# Altium footprint library Design III PCB Library.PcbLib: 89 footprints (part 1 of 6)
Each footprint in its own frame and in the unit in brackets; x right, y up, seen from the top. Pads: shape width x height; smd on the part's side, far side on the other; paste and mask are expansions set on the pad; w line width, h text height; cw(c..) or ccw(c..) is an arc to the next point about the centre after c.
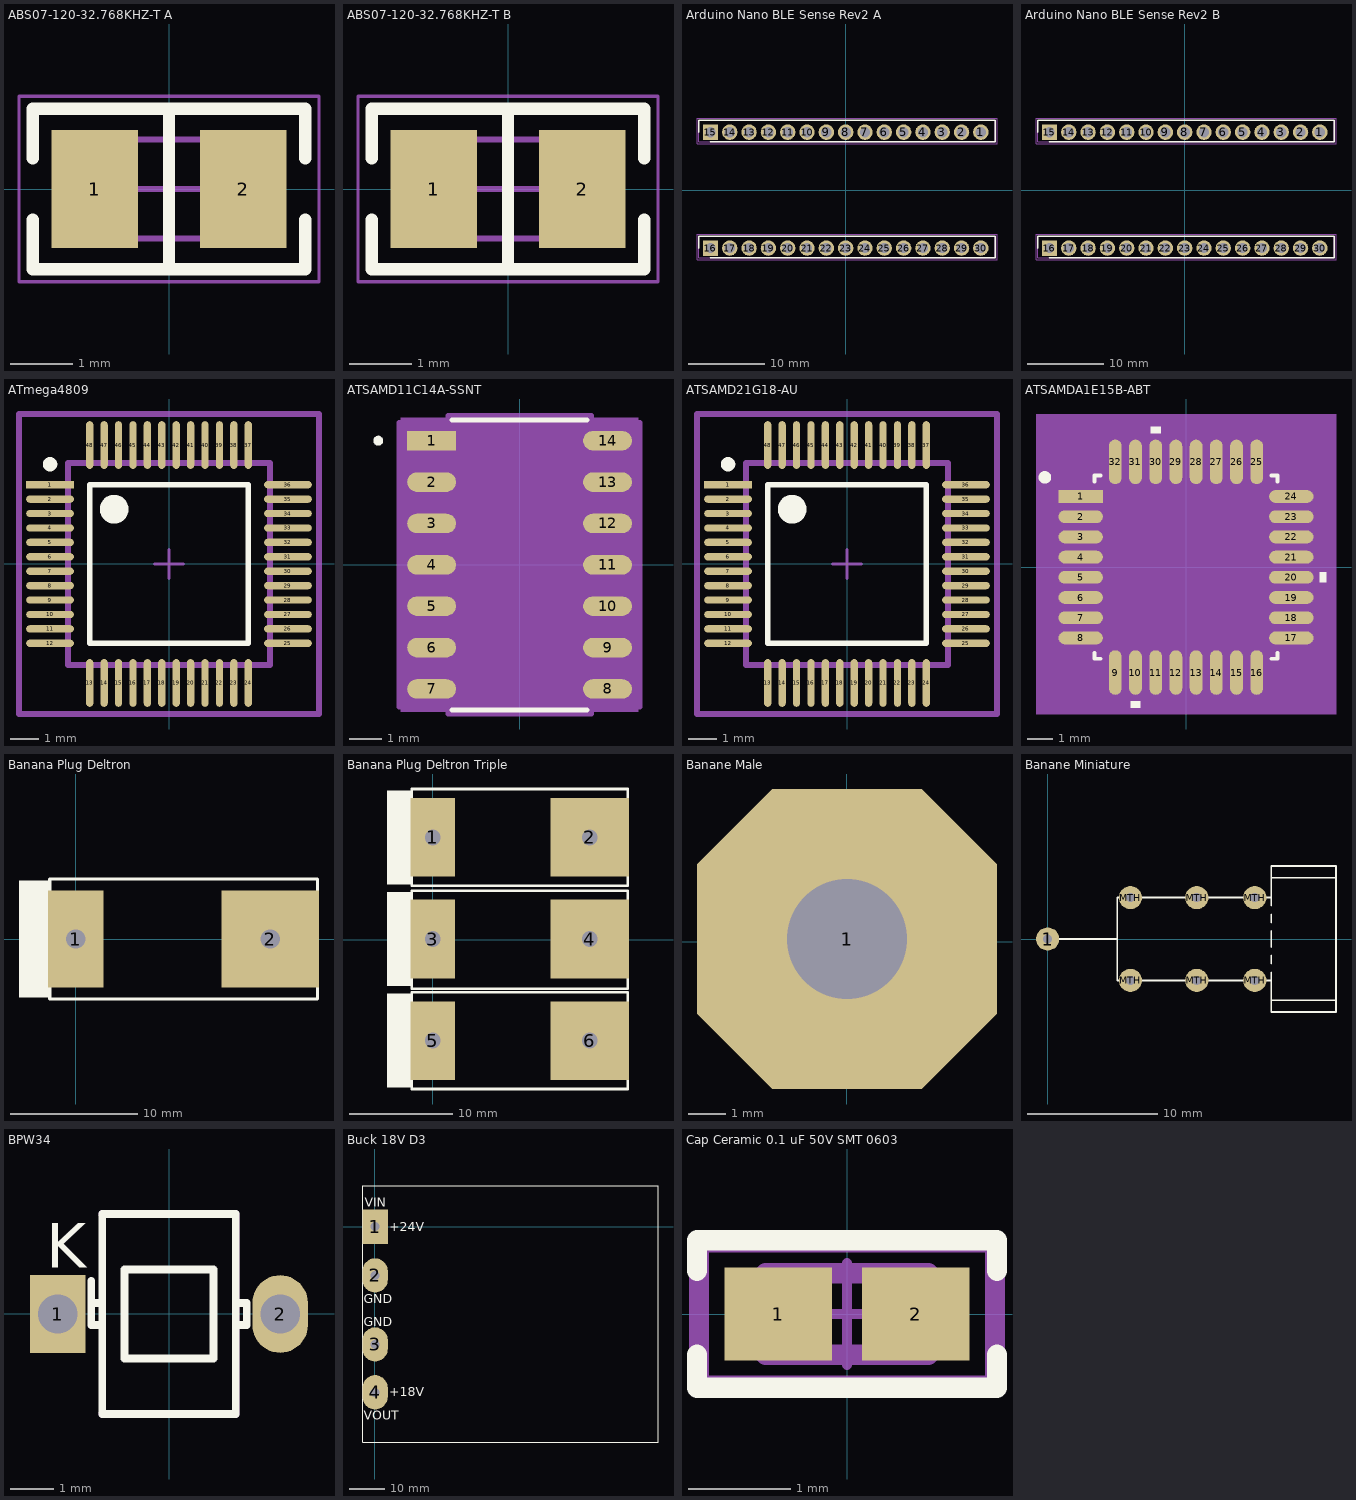
[diagram p0: the footprints below, top view; thin cyan lines are the x and y axes]

## ABS07-120-32.768KHZ-T A [mm] "32.768 kHz ±20ppm Crystal 6pF 55 kOhms 2-SMD, No Lead"
pads (2):
  rect 1.4x1.9 smd: 1(-1.2,0) 2(1.2,0)
Top Overlay:
  lines w0.2: -2.2,-0.5 -2.2,-1.3 2.2,-1.3 2.2,-0.5 ; -2.2,0.5 -2.2,1.3 2.2,1.3 2.2,0.5 ; 0,-1.3 0,1.3
Mechanical 13:
  lines w0.1: -1.65,-0.8 1.65,-0.8 1.65,0.8 -1.65,0.8 -1.65,-0.8
Mechanical 15:
  lines w0.05: -2.425,-1.5 -2.425,1.5 2.425,1.5 2.425,-1.5 -2.425,-1.5
  lines w0.1: -0.5,0 0.5,0 ; 0,-0.5 0,0.5
3D body "Crys_Abracon_ABS07-120-32_768KHZ-T_eec.STEP": height 0.25, standoff 0, extent -1.85,-1 1.85,1

## ABS07-120-32.768KHZ-T B [mm] "32.768 kHz ±20ppm Crystal 6pF 55 kOhms 2-SMD, No Lead"
pads (2):
  rect 1.4x1.9 smd: 1(-1.2,0) 2(1.2,0)
Top Overlay:
  lines w0.2: -2.2,-0.5 -2.2,-1.3 2.2,-1.3 2.2,-0.5 ; -2.2,0.5 -2.2,1.3 2.2,1.3 2.2,0.5 ; 0,-1.3 0,1.3
Mechanical 13:
  lines w0.1: -1.65,-0.8 1.65,-0.8 1.65,0.8 -1.65,0.8 -1.65,-0.8
Mechanical 15:
  lines w0.05: -2.425,-1.5 2.425,-1.5 2.425,1.5 -2.425,1.5 -2.425,-1.5
  lines w0.1: -0.5,0 0.5,0 ; 0,-0.5 0,0.5
3D body "Abracon ABS07.STEP": height 0.9, standoff 0, extent -1.625,-0.775 1.625,0.775

## Arduino Nano BLE Sense Rev2 A [mm] "ABX00069, nRF52840 64MHz, 256 KB SRAM, 1MB flash, 14 I/O pins, 8 Analog inputs"
pads (30):
  round 2.025 hole 1.35: 1(17.78,7.62) 2(15.24,7.62) 3(12.7,7.62) 4(10.16,7.62) 5(7.62,7.62) 6(5.08,7.62) 7(2.54,7.62) 8(0,7.62) 9(-2.54,7.62) 10(-5.08,7.62) 11(-7.62,7.62) 12(-10.16,7.62) 13(-12.7,7.62) 14(-15.24,7.62) 17(-15.24,-7.62) 18(-12.7,-7.62) 19(-10.16,-7.62) 20(-7.62,-7.62) 21(-5.08,-7.62) 22(-2.54,-7.62) 23(0,-7.62) 24(2.54,-7.62) 25(5.08,-7.62) 26(7.62,-7.62) 27(10.16,-7.62) 28(12.7,-7.62) 29(15.24,-7.62) 30(17.78,-7.62)
  rect 2.025x2.025 hole 1.35: 15(-17.78,7.62) 16(-17.78,-7.62)
Top Overlay:
  lines w0.2: -19.3,-7.62 -19.3,-6.05 19.65,-6.05 19.65,-8.89 -17.78,-8.89 ; -19.3,7.62 -19.3,9.19 19.65,9.19 19.65,6.35 -17.78,6.35
Mechanical 13:
  lines w0.1: -19.3,-8.89 -19.3,-6.05 19.65,-6.05 19.65,-8.89 -19.3,-8.89 ; -19.3,6.35 -19.3,9.19 19.65,9.19 19.65,6.35 -19.3,6.35
Mechanical 15:
  lines w0.05: -19.55,-9.14 -19.55,-5.8 19.9,-5.8 19.9,-9.14 -19.55,-9.14 ; -19.55,6.1 -19.55,9.44 19.9,9.44 19.9,6.1 -19.55,6.1
3D body "Arduino Nano BLE Sense Rev2.STEP": height 6.65, standoff -6.2, extent -23.06,-8.89 21.59,8.943

## Arduino Nano BLE Sense Rev2 B [mm] "ABX00069, nRF52840 64MHz, 256 KB SRAM, 1MB flash, 14 I/O pins, 8 Analog inputs"
pads (30):
  round 2.025 hole 1.35: 1(17.78,7.62) 2(15.24,7.62) 3(12.7,7.62) 4(10.16,7.62) 5(7.62,7.62) 6(5.08,7.62) 7(2.54,7.62) 8(0,7.62) 9(-2.54,7.62) 10(-5.08,7.62) 11(-7.62,7.62) 12(-10.16,7.62) 13(-12.7,7.62) 14(-15.24,7.62) 17(-15.24,-7.62) 18(-12.7,-7.62) 19(-10.16,-7.62) 20(-7.62,-7.62) 21(-5.08,-7.62) 22(-2.54,-7.62) 23(0,-7.62) 24(2.54,-7.62) 25(5.08,-7.62) 26(7.62,-7.62) 27(10.16,-7.62) 28(12.7,-7.62) 29(15.24,-7.62) 30(17.78,-7.62)
  rect 2.025x2.025 hole 1.35: 15(-17.78,7.62) 16(-17.78,-7.62)
Top Overlay:
  lines w0.2: -19.3,-7.62 -19.3,-6.05 19.65,-6.05 19.65,-8.89 -17.78,-8.89 ; -19.3,7.62 -19.3,9.19 19.65,9.19 19.65,6.35 -17.78,6.35
Mechanical 13:
  lines w0.1: -19.3,-8.89 -19.3,-6.05 19.65,-6.05 19.65,-8.89 -19.3,-8.89 ; -19.3,6.35 -19.3,9.19 19.65,9.19 19.65,6.35 -19.3,6.35
Mechanical 15:
  lines w0.05: -19.55,-9.14 -19.55,-5.8 19.9,-5.8 19.9,-9.14 -19.55,-9.14 ; -19.55,6.1 -19.55,9.44 19.9,9.44 19.9,6.1 -19.55,6.1

## ATmega4809 [mm] "AVR megaAVR® 0, Functional Safety (FuSa) Microcontroller IC 8-Bit 20MHz 48KB (24K x 16) FLASH 48-TQFP (7x7)"
pads (48):
  rect 1.655x0.252 smd paste+0 mask+0: 1(-4.125,2.75)
  rrect100% 1.655x0.252 smd paste+0 mask+0: 2(-4.125,2.25) 3(-4.125,1.75) 4(-4.125,1.25) 5(-4.125,0.75) 6(-4.125,0.25) 7(-4.125,-0.25) 8(-4.125,-0.75) 9(-4.125,-1.25) 10(-4.125,-1.75) 11(-4.125,-2.25) 12(-4.125,-2.75) 25(4.125,-2.75) 26(4.125,-2.25) 27(4.125,-1.75) 28(4.125,-1.25) 29(4.125,-0.75) 30(4.125,-0.25) 31(4.125,0.25) 32(4.125,0.75) 33(4.125,1.25) 34(4.125,1.75) 35(4.125,2.25) 36(4.125,2.75)
  rrect100% 0.252x1.655 smd paste+0 mask+0: 13(-2.75,-4.125) 14(-2.25,-4.125) 15(-1.75,-4.125) 16(-1.25,-4.125) 17(-0.75,-4.125) 18(-0.25,-4.125) 19(0.25,-4.125) 20(0.75,-4.125) 21(1.25,-4.125) 22(1.75,-4.125) 23(2.25,-4.125) 24(2.75,-4.125) 37(2.75,4.125) 38(2.25,4.125) 39(1.75,4.125) 40(1.25,4.125) 41(0.75,4.125) 42(0.25,4.125) 43(-0.25,4.125) 44(-0.75,4.125) 45(-1.25,4.125) 46(-1.75,4.125) 47(-2.25,4.125) 48(-2.75,4.125)
Top Overlay:
  circle w0.25: c-4.125,3.46 r0.125
  circle w0.5: c-1.9,1.9 r0.25
  lines w0.2: -2.75,-2.75 2.75,-2.75 2.75,2.75 -2.75,2.75 -2.75,-2.75
Top Assembly:
  lines w0.2: -5.203,-5.203 5.203,-5.203 5.203,5.203 -5.203,5.203 -5.203,-5.203
Top Courtyard:
  lines w0.2: -5.203,-5.203 5.203,-5.203 5.203,5.203 -5.203,5.203 -5.203,-5.203
Board:
  lines w0.2: -3.5,-3.5 3.5,-3.5 3.5,3.5 -3.5,3.5 -3.5,-3.5
Top Component Center:
  lines w0.1: -0.5,0 0.5,0 ; 0,-0.5 0,0.5
3D body "IC_Microchip_PIC24FJ256GA705-I-PT_eec.STEP": height 0.25, standoff 0, extent -5.203,-5.203 5.203,5.203

## ATSAMD11C14A-SSNT [mm] "ARM® Cortex®-M0+ SAM D11C Microcontroller IC 32-Bit Single-Core 48MHz 16KB (16K x 8) FLASH 14-SOIC"
pads (14):
  rect 1.5x0.6 smd paste+0 mask+0: 1(-2.7,3.81)
  oval 1.5x0.6 smd paste+0 mask+0: 2(-2.7,2.54) 3(-2.7,1.27) 4(-2.7,0) 5(-2.7,-1.27) 6(-2.7,-2.54) 7(-2.7,-3.81) 8(2.7,-3.81) 9(2.7,-2.54) 10(2.7,-1.27) 11(2.7,0) 12(2.7,1.27) 13(2.7,2.54) 14(2.7,3.81)
Top Overlay:
  circle w0.152: c-4.339,3.81 r0.076
  lines w0.152: -2.077,-4.452 2.077,-4.452 ; -2.077,4.452 2.077,4.452
Mechanical 5:
  region: 3.641,-4.516 -3.641,-4.516 -3.641,4.516 3.641,4.516
Mechanical 13:
  circle w0: c-1.696,3.81 r0.038
  lines w0: -0.305,4.325 ccw(c0,4.325) 0.305,4.325
  lines w0.025: -1.95,-4.325 1.95,-4.325 1.95,4.325 -1.95,4.325 -1.95,-4.325
Mechanical 15:
  region: -2.204,-4.364 -3.704,-4.364 -3.704,4.364 -2.204,4.364 -2.204,4.579 2.204,4.579 2.204,4.364 3.704,4.364 3.704,-4.364 2.204,-4.364 2.204,-4.579 -2.204,-4.579
  lines w0.152: -3.704,-4.364 -3.704,4.364 -2.204,4.364 -2.204,4.579 2.204,4.579 2.204,4.364 3.704,4.364 3.704,-4.364 2.204,-4.364 2.204,-4.579 -2.204,-4.579 -2.204,-4.364 -3.704,-4.364
3D body "SOIC14_SL_MCH.step": height 1.75, standoff 0, extent -3.1,-4.325 3.1,4.325

## ATSAMD21G18-AU [mm] "ARM® Cortex®-M0+ SAM D21G, Functional Safety (FuSa) Microcontroller IC 32-Bit Single-Core 48MHz 256KB (256K x 8) FLASH 48-TQFP (7x7)"
pads (48):
  rect 1.655x0.252 smd paste+0 mask+0: 1(-4.125,2.75)
  rrect100% 1.655x0.252 smd paste+0 mask+0: 2(-4.125,2.25) 3(-4.125,1.75) 4(-4.125,1.25) 5(-4.125,0.75) 6(-4.125,0.25) 7(-4.125,-0.25) 8(-4.125,-0.75) 9(-4.125,-1.25) 10(-4.125,-1.75) 11(-4.125,-2.25) 12(-4.125,-2.75) 25(4.125,-2.75) 26(4.125,-2.25) 27(4.125,-1.75) 28(4.125,-1.25) 29(4.125,-0.75) 30(4.125,-0.25) 31(4.125,0.25) 32(4.125,0.75) 33(4.125,1.25) 34(4.125,1.75) 35(4.125,2.25) 36(4.125,2.75)
  rrect100% 0.252x1.655 smd paste+0 mask+0: 13(-2.75,-4.125) 14(-2.25,-4.125) 15(-1.75,-4.125) 16(-1.25,-4.125) 17(-0.75,-4.125) 18(-0.25,-4.125) 19(0.25,-4.125) 20(0.75,-4.125) 21(1.25,-4.125) 22(1.75,-4.125) 23(2.25,-4.125) 24(2.75,-4.125) 37(2.75,4.125) 38(2.25,4.125) 39(1.75,4.125) 40(1.25,4.125) 41(0.75,4.125) 42(0.25,4.125) 43(-0.25,4.125) 44(-0.75,4.125) 45(-1.25,4.125) 46(-1.75,4.125) 47(-2.25,4.125) 48(-2.75,4.125)
Top Overlay:
  circle w0.25: c-4.125,3.46 r0.125
  circle w0.5: c-1.9,1.9 r0.25
  lines w0.2: -2.75,-2.75 2.75,-2.75 2.75,2.75 -2.75,2.75 -2.75,-2.75
Top Assembly:
  lines w0.2: -5.203,-5.203 5.203,-5.203 5.203,5.203 -5.203,5.203 -5.203,-5.203
Top 3D Body:
  lines w0.2: -3.5,-3.5 3.5,-3.5 3.5,3.5 -3.5,3.5 -3.5,-3.5
Top Courtyard:
  lines w0.2: -5.203,-5.203 5.203,-5.203 5.203,5.203 -5.203,5.203 -5.203,-5.203
Top Component Center:
  lines w0.1: -0.5,0 0.5,0 ; 0,-0.5 0,0.5
3D body "IC_Microchip_PIC24FJ256GA705-I-PT_eec.STEP": height 0.25, standoff 0, extent -5.203,-5.203 5.203,5.203

## ATSAMDA1E15B-ABT [mm]
pads (32):
  rect 1.762x0.507 smd paste+0 mask+0: 1(-4.169,2.8)
  oval 1.762x0.507 smd paste+0 mask+0: 2(-4.169,2) 3(-4.169,1.2) 4(-4.169,0.4) 5(-4.169,-0.4) 6(-4.169,-1.2) 7(-4.169,-2) 8(-4.169,-2.8) 17(4.169,-2.8) 18(4.169,-2) 19(4.169,-1.2) 20(4.169,-0.4) 21(4.169,0.4) 22(4.169,1.2) 23(4.169,2) 24(4.169,2.8)
  oval 0.507x1.762 smd paste+0 mask+0: 9(-2.8,-4.169) 10(-2,-4.169) 11(-1.2,-4.169) 12(-0.4,-4.169) 13(0.4,-4.169) 14(1.2,-4.169) 15(2,-4.169) 16(2.8,-4.169) 25(2.8,4.169) 26(2,4.169) 27(1.2,4.169) 28(0.4,4.169) 29(-0.4,4.169) 30(-1.2,4.169) 31(-2,4.169) 32(-2.8,4.169)
Top Overlay:
  circle w0.25: c-5.588,3.556 r0.125
  region: -1.81,-5.304 -2.191,-5.304 -2.191,-5.558 -1.81,-5.558
  region: 5.304,-0.209 5.558,-0.209 5.558,-0.59 5.304,-0.59
  region: -1.01,5.304 -1.391,5.304 -1.391,5.558 -1.01,5.558
  lines w0.152: -3.627,-3.386 -3.627,-3.627 -3.386,-3.627 ; -3.627,3.386 -3.627,3.627 -3.386,3.627 ; 3.386,-3.627 3.627,-3.627 3.627,-3.386 ; 3.386,3.627 3.627,3.627 3.627,3.386
Mechanical 5:
  region: 5.939,-5.812 -5.939,-5.812 -5.939,6.066 5.939,6.066
Mechanical 13:
  lines w0.025: -3.5,2.23 -2.23,3.5 ; -4.5,-3.029 -4.5,-2.571 -3.5,-2.571 -3.5,-3.029 -4.5,-3.029 ; -4.5,-2.229 -4.5,-1.771 -3.5,-1.771 -3.5,-2.229 -4.5,-2.229 ; -4.5,-1.429 -4.5,-0.971 -3.5,-0.971 -3.5,-1.429 -4.5,-1.429 ; -4.5,-0.629 -4.5,-0.171 -3.5,-0.171 -3.5,-0.629 -4.5,-0.629 ; -4.5,0.171 -4.5,0.629 -3.5,0.629 -3.5,0.171 -4.5,0.171 ; -4.5,0.971 -4.5,1.429 -3.5,1.429 -3.5,0.971 -4.5,0.971 ; -4.5,1.771 -4.5,2.229 -3.5,2.229 -3.5,1.771 -4.5,1.771 ; -4.5,2.571 -4.5,3.029 -3.5,3.029 -3.5,2.571 -4.5,2.571 ; -3.5,-3.5 -3.5,3.5 3.5,3.5 3.5,-3.5 -3.5,-3.5 ; -3.029,-4.5 -3.029,-3.5 -2.571,-3.5 -2.571,-4.5 -3.029,-4.5 ; -3.029,3.5 -2.571,3.5 -2.571,4.5 -3.029,4.5 -3.029,3.5 ; -2.229,-4.5 -2.229,-3.5 -1.771,-3.5 -1.771,-4.5 -2.229,-4.5 ; -2.229,3.5 -1.771,3.5 -1.771,4.5 -2.229,4.5 -2.229,3.5 ; -1.429,-4.5 -1.429,-3.5 -0.971,-3.5 -0.971,-4.5 -1.429,-4.5 ; -1.429,3.5 -0.971,3.5 -0.971,4.5 -1.429,4.5 -1.429,3.5 ; -0.629,-4.5 -0.629,-3.5 -0.171,-3.5 -0.171,-4.5 -0.629,-4.5 ; -0.629,3.5 -0.171,3.5 -0.171,4.5 -0.629,4.5 -0.629,3.5 ; 0.171,-4.5 0.171,-3.5 0.629,-3.5 0.629,-4.5 0.171,-4.5 ; 0.171,3.5 0.629,3.5 0.629,4.5 0.171,4.5 0.171,3.5 ; 0.971,-4.5 0.971,-3.5 1.429,-3.5 1.429,-4.5 0.971,-4.5 ; 0.971,3.5 1.429,3.5 1.429,4.5 0.971,4.5 0.971,3.5 ; 1.771,-4.5 1.771,-3.5 2.229,-3.5 2.229,-4.5 1.771,-4.5 ; 1.771,3.5 2.229,3.5 2.229,4.5 1.771,4.5 1.771,3.5 ; 2.571,-4.5 2.571,-3.5 3.029,-3.5 3.029,-4.5 2.571,-4.5 ; 2.571,3.5 3.029,3.5 3.029,4.5 2.571,4.5 2.571,3.5 ; 3.5,-3.029 3.5,-2.571 4.5,-2.571 4.5,-3.029 3.5,-3.029 ; 3.5,-2.229 3.5,-1.771 4.5,-1.771 4.5,-2.229 3.5,-2.229 ; 3.5,-1.429 3.5,-0.971 4.5,-0.971 4.5,-1.429 3.5,-1.429 ; 3.5,-0.629 3.5,-0.171 4.5,-0.171 4.5,-0.629 3.5,-0.629 ; 3.5,0.171 3.5,0.629 4.5,0.629 4.5,0.171 3.5,0.171 ; 3.5,0.971 3.5,1.429 4.5,1.429 4.5,0.971 3.5,0.971 ; 3.5,1.771 3.5,2.229 4.5,2.229 4.5,1.771 3.5,1.771 ; 3.5,2.571 3.5,3.029 4.5,3.029 4.5,2.571 3.5,2.571
  text "*" at -3.436,2.565 h1.27
Mechanical 15:
  region: -3.562,-4.008 -4.008,-4.008 -4.008,-3.562 -5.558,-3.562 -5.558,3.562 -4.008,3.562 -4.008,4.008 -3.562,4.008 -3.562,5.558 3.562,5.558 3.562,4.008 4.008,4.008 4.008,3.562 5.558,3.562 5.558,-3.562 4.008,-3.562 4.008,-4.008 3.562,-4.008 3.562,-5.558 -3.562,-5.558
  lines w0.152: -5.558,-3.562 -4.008,-3.562 -4.008,-4.008 -3.562,-4.008 -3.562,-5.558 3.562,-5.558 3.562,-4.008 4.008,-4.008 4.008,-3.562 5.558,-3.562 5.558,3.562 4.008,3.562 4.008,4.008 3.562,4.008 3.562,5.558 -3.562,5.558 -3.562,4.008 -4.008,4.008 -4.008,3.562 -5.558,3.562 -5.558,-3.562
3D body "TQFP32_MC_MCH.step": height 1.2, standoff 0, extent -4.5,-4.5 4.5,4.5

## Banana Plug Deltron [mil] "Banana Plug Deltron"
pads (2):
  rect 170x300 hole 60: 1(0,0)
  rect 300x300 hole 60: 2(600,0)
Top Overlay:
  rectangle: -175,-180 -80,180
  lines w10: -80,-185 -80,185 745,185 745,-185 -80,-185
3D body: height 490, standoff 130, extent -175,-180 -75,180
3D body: height 500, standoff 5, extent -85,-190 750,190

## Banana Plug Deltron Triple [mil] "Banana Plug Deltron Triple"
pads (6):
  rect 170x300 hole 60: 1(0,390.56) 3(0,2.56) 5(0,-385.44)
  rect 300x300 hole 60: 2(600,390.56) 4(600,2.56) 6(600,-385.44)
Top Overlay:
  rectangle: -175,-177.44 -80,182.56
  rectangle: -175,-565.44 -80,-205.44
  rectangle: -175,210.56 -80,570.56
  lines w10: -80,-570.44 -80,-200.44 745,-200.44 745,-570.44 -80,-570.44 ; -80,-187.44 745,-187.44 745,187.56 -80,187.56 -80,-187.44 ; -80,205.56 -80,575.56 745,575.56 745,205.56 -80,205.56
3D body: height 500, standoff 5, extent -85,-189.44 750,194.56
3D body: height 490, standoff 130, extent -175,-177.44 -85,182.56
3D body: height 490, standoff 130, extent -175,210.56 -85,570.56
3D body: height 500, standoff 5, extent -85,198.56 750,582.56
3D body: height 490, standoff 130, extent -175,-565.44 -85,-205.44
3D body: height 500, standoff 5, extent -85,-577.44 750,-193.44
3D body: height 200, standoff 0, extent -29.76,-27.38 30,32.5
3D body: height 200, standoff 0, extent -29.76,360.62 30,420.5
3D body: height 200, standoff 0, extent 570.25,-415.37 630.01,-355.49
3D body: height 200, standoff 0, extent 570.24,-27.38 630.01,32.5
3D body: height 200, standoff 0, extent 570.25,360.63 630.01,420.51
3D body: height 200, standoff 0, extent -29.76,-415.38 30.01,-355.5

## Banane Male [mil] "Johnson 108-0753-001"
pads (1):
  oct 312x312 hole 125: 1(0.21,3.03)
3D body: height 100, standoff 5, extent -155.79,-152.97 156.21,159.03
3D body: height 445, standoff 175, extent -133.49,-131.4 135.21,137.46
3D body: height 315, standoff 100, extent -133.72,-131.7 135.21,137.76
3D body: height 900, standoff 400, extent -79.16,-76.81 80.21,82.87
3D body: height 980, standoff 820, extent -79.01,-76.62 80.22,82.69

## Banane Miniature [mil] "Banane Miniature"
pads (7):
  round 70 hole 27.6: 1(0.02,1.07) MTH(250.02,-123.93) MTH(250.02,126.07) MTH(450.02,-123.93) MTH(450.02,126.07) MTH(625.02,-123.93) MTH(625.02,126.07)
Top Overlay:
  lines w5: 0.02,1.07 210.02,1.07 ; 675.02,-183.93 870.02,-183.93 ; 675.02,-98.93 675.02,-123.93 ; 675.02,-73.93 675.02,-48.93 ; 675.02,-23.93 675.02,26.07 ; 675.02,51.07 675.02,76.07 ; 675.02,101.07 675.02,126.07 ; 675.02,186.07 870.02,186.07 ; 675.02,-123.93 675.02,-218.93 870.02,-218.93 870.02,221.07 675.02,221.07 675.02,126.07 ; 675.02,-123.93 210.02,-123.93 210.02,126.07 675.02,126.07
3D body "User Library-Bananajack red.STEP": height 349.09, standoff -89.09, extent -69.98,-218.03 868.21,220.16

## BPW34 [mil] "Photodiode 850nm 20ns 120° 2-DIP (0.213\", 5.40mm)"
pads (2):
  rect 50x70 hole 35.4: 1(-100,-0.21)
  oval 50x70 hole 35.4: 2(100,-0.21)
Top Overlay:
  lines w7: -70,9.79 -60,9.79 ; -70,29.79 -70,-10.21 -60,-10.21 ; 60,-10.21 70,-10.21 70,9.79 60,9.79 ; -60,-90.21 -60,89.79 60,89.79 60,-90.21 -60,-90.21 ; -40,-40.21 -40,-0.21 -40,39.79 40,39.79 40,-40.21 -40,-40.21
  text "K" at -110.36,41.38 h40
Top Assembly:
  lines w7: -60,-90.21 60,-90.21 60,89.79 -60,89.79
3D body: height 70, standoff 10, extent -60,-90.21 60,89.79
3D body: height 77, standoff 75, extent -40,-40.21 40,39.79

## BPW34 - B [mm] "Photodiode 850nm 20ns 120° 2-DIP (0.213\", 5.40mm)"

## Buck 18V D3 [mil] "Buck 18V D3"
pads (4):
  rect 280x380 hole 100: 1(1.66,0.26)
  oval 280x380 hole 100: 2(1.66,-539.74) 3(1.66,-1304.74) 4(1.66,-1834.74)
Top Overlay:
  lines w5: -138.34,-2389.74 3136.66,-2389.74 3136.66,455.26 -138.34,455.26 -138.34,-2389.74
  text "VIN" at -113.34,220.26 h100
  text "+24V" at 156.66,-49.74 h100
  text "+18V" at 156.66,-1879.74 h100
  text "VOUT" at -123.34,-2139.74 h100
  text "GND" at -123.34,-1104.74 h100
  text "GND" at -123.34,-849.74 h100
3D body: height 410, standoff 360, extent 1186.65,-414.74 1361.66,-364.74
3D body: height 360, standoff 190, extent 1186.66,-414.74 1236.66,-364.74
3D body: height 62, standoff 0, extent -98.34,-1934.74 101.66,-1734.74
3D body: height 220, standoff -180, extent -40.34,-1876.73 43.66,-1792.73
3D body: height 62, standoff 0, extent -98.34,-1934.74 101.66,-1734.74
3D body: height 125, standoff 63, extent -98.34,-1934.74 101.66,-1734.74
3D body: height 260, standoff 190, extent -88.24,-1924.71 91.66,-1744.76
3D body: height 265, standoff 258, extent -43.34,-1879.74 46.66,-1789.74
3D body: height 62, standoff 0, extent -98.34,-1404.74 101.66,-1204.74
3D body: height 220, standoff -180, extent -40.34,-1346.74 43.66,-1262.74
3D body: height 62, standoff 0, extent -98.34,-1404.74 101.66,-1204.74
3D body: height 125, standoff 63, extent -98.34,-1404.74 101.66,-1204.74
3D body: height 260, standoff 190, extent -88.24,-1394.71 91.66,-1214.76
3D body: height 265, standoff 258, extent -43.34,-1349.74 46.66,-1259.74
3D body: height 62, standoff 0, extent -99.16,-640.39 100.84,-440.39
3D body: height 220, standoff -180, extent -41.15,-582.38 42.85,-498.38
3D body: height 62, standoff 0, extent -99.16,-640.39 100.84,-440.39
3D body: height 125, standoff 63, extent -99.16,-640.39 100.84,-440.39
3D body: height 260, standoff 190, extent -89.05,-630.36 90.85,-450.41
3D body: height 265, standoff 258, extent -44.15,-585.39 45.85,-495.39
3D body: height 269, standoff 190, extent 351.66,-329.73 451.66,-319.73
3D body: height 269, standoff 190, extent 351.66,-319.73 451.66,-219.73
3D body: height 269, standoff 190, extent 456.66,-329.73 556.66,-319.73
3D body: height 269, standoff 190, extent 456.66,-319.73 556.66,-219.73
3D body: height 269, standoff 190, extent 561.66,-329.73 661.66,-319.73
3D body: height 269, standoff 190, extent 561.66,-319.73 661.66,-219.73
3D body: height 269, standoff 190, extent 666.66,-329.73 766.66,-319.73
3D body: height 269, standoff 190, extent 666.66,-319.73 766.66,-219.73
3D body: height 269, standoff 190, extent 771.66,-329.73 871.66,-319.73
3D body: height 269, standoff 190, extent 771.66,-319.73 871.66,-219.73
3D body: height 269, standoff 190, extent 876.66,-329.73 976.66,-319.73
3D body: height 269, standoff 190, extent 876.66,-319.73 976.66,-219.73
3D body: height 269, standoff 190, extent 981.66,-329.73 1081.66,-319.73
3D body: height 269, standoff 190, extent 981.66,-319.73 1081.66,-219.73
3D body: height 360, standoff 190, extent 911.66,-699.74 961.66,-649.74
3D body: height 360, standoff 190, extent 911.66,-574.74 961.66,-524.74
3D body: height 360, standoff 190, extent 911.66,-449.74 961.66,-399.74
3D body: height 360, standoff 190, extent 911.66,-139.74 961.66,-89.74
3D body: height 360, standoff 190, extent 911.66,-14.74 961.66,35.26
3D body: height 410, standoff 360, extent 211.66,-574.74 961.66,-524.74
3D body: height 191, standoff 190, extent -128.34,-854.74 -53.34,-744.74
3D body: height 191, standoff 190, extent 71.66,-854.74 146.66,-744.74
3D body: height 191, standoff 190, extent -28.34,-854.74 46.66,-744.74
3D body: height 191, standoff 190, extent 171.66,-2144.74 246.66,-2034.74
3D body: height 191, standoff 190, extent 71.66,-2144.74 146.66,-2034.74
3D body: height 191, standoff 190, extent -28.34,-2144.74 46.66,-2034.74
3D body: height 191, standoff 190, extent -128.34,-2144.74 -48.34,-2034.74
3D body: height 191, standoff 190, extent 66.66,215.26 141.66,325.26
3D body: height 191, standoff 190, extent -18.34,215.26 26.66,325.26
3D body: height 191, standoff 190, extent -118.34,215.26 -38.34,325.26
3D body: height 186, standoff 185, extent 2346.66,-729.74 3061.66,-329.74
3D body: height 186, standoff 185, extent 2346.66,-2164.74 3061.66,-809.74
3D body: height 186, standoff 185, extent -138.34,-2069.74 1541.66,-1599.74
3D body: height 186, standoff 185, extent -138.34,-1539.74 1541.66,-1069.74
3D body: height 186, standoff 185, extent -138.34,-774.74 1541.66,-304.74
3D body: height 186, standoff 185, extent -138.34,-234.74 1541.66,235.26
3D body: height 269, standoff 190, extent 1086.66,-319.74 1186.66,-219.74
3D body: height 269, standoff 190, extent 1086.66,-329.74 1186.66,-319.74
3D body: height 265, standoff 258, extent -43.34,-44.74 46.66,45.26
3D body: height 260, standoff 190, extent -88.23,-89.71 91.67,90.24
3D body: height 185, standoff 130, extent -138.34,-2389.74 3136.66,455.26
3D body: height 505, standoff 190, extent 2471.66,-1009.74 2941.66,-539.74
3D body: height 509, standoff 504, extent 2518.87,-962.68 2894.66,-586.79
3D body: height 311, standoff 309, extent 1366.66,-1664.74 1541.66,-1634.74
3D body: height 310, standoff 190, extent 1366.66,-1719.74 1541.66,-1429.74
3D body: height 311, standoff 309, extent 1186.66,-1664.74 1361.66,-1634.74
3D body: height 310, standoff 190, extent 1186.66,-1719.74 1361.66,-1429.74
3D body: height 215, standoff 190, extent 1711.66,-1039.74 1911.66,-839.74
3D body: height 290, standoff 190, extent 1656.66,-279.74 1956.66,20.26
3D body: height 290, standoff 190, extent 1846.66,-654.74 2146.66,-354.74
3D body: height 475, standoff 295, extent 1361.66,-464.74 1761.66,-64.74
3D body: height 350, standoff 295, extent 1761.66,-464.74 2061.66,-64.74
3D body: height 525, standoff 520, extent 561.66,-189.74 686.66,225.26
3D body: height 525, standoff 520, extent 561.66,-764.74 686.66,-344.74
3D body: height 315, standoff 175, extent 261.66,-139.74 436.66,160.26
3D body: height 410, standoff 360, extent 211.66,-14.74 961.66,35.26
3D body: height 410, standoff 360, extent 211.66,110.26 961.66,160.26
3D body: height 410, standoff 360, extent 211.66,-139.74 961.66,-89.74
3D body: height 360, standoff 190, extent 911.66,110.26 961.66,160.26
3D body: height 245, standoff 190, extent 436.66,-139.74 561.66,160.26
3D body: height 245, standoff 190, extent 436.66,-699.74 561.66,-399.74
3D body: height 315, standoff 190, extent 261.66,-699.74 436.66,-399.74
3D body: height 410, standoff 360, extent 211.66,-699.74 961.66,-649.74
3D body: height 410, standoff 360, extent 211.66,-449.74 961.66,-399.74
3D body: height 360, standoff 190, extent 1186.66,-164.74 1236.66,-114.74
3D body: height 410, standoff 360, extent 1186.65,-164.74 1361.66,-114.74
3D body: height 130, standoff 30, extent 2761.66,85.26 3111.66,435.26
3D body: height 130, standoff 30, extent 2761.66,-2364.74 3111.66,-2014.74
3D body: height 125, standoff 63, extent -98.34,-99.74 101.66,100.26
3D body: height 62, standoff 0, extent -98.34,-99.74 101.66,100.26
3D body: height 222, standoff -178, extent -40.34,-41.73 43.66,42.27
3D body: height 62, standoff 0, extent -98.34,-99.74 101.66,100.26
3D body: height 135, standoff 65, extent -48.24,-639.71 131.66,-459.76
3D body: height 140, standoff 133, extent -3.34,-594.74 86.66,-504.74
3D body: height 220, standoff -180, extent -40.34,-1346.74 43.66,-1262.74
3D body: height 62, standoff 0, extent -98.34,-1404.74 101.66,-1204.74
3D body: height 135, standoff 65, extent -88.24,-1394.71 91.66,-1214.76
3D body: height 140, standoff 133, extent -43.34,-1349.74 46.66,-1259.74
3D body: height 135, standoff 65, extent -48.24,-1934.71 131.66,-1754.76
3D body: height 140, standoff 133, extent -3.34,-1889.74 86.66,-1799.74
3D body: height 200, standoff 190, extent 1626.65,-229.74 1656.66,-29.74
3D body: height 200, standoff 190, extent 2146.65,-604.74 2176.66,-404.74
3D body: height 200, standoff 190, extent 1956.66,-39.74 1996.66,-9.74
3D body: height 200, standoff 190, extent 1956.66,-249.74 1996.66,-219.74
3D body: height 200, standoff 190, extent 1806.66,-624.74 1846.66,-594.74
3D body: height 200, standoff 190, extent 1806.66,-414.74 1846.66,-384.74
3D body: height 352, standoff 350, extent 1866.75,-344.71 2016.66,-194.76
3D body "RESISTOR 0.25W 0.4.STEP": height 405.5, standoff 190, extent 1261.15,-1778.74 1352.16,-1354.74
3D body "Led 3mm vert.STEP": height 340.51, standoff 214, extent 1007.59,-1429.59 1301.66,-1299.74
3D body: height 191, standoff 190, extent 1560.41,-812.24 1642.91,-737.24
3D body: height 191, standoff 190, extent 1560.41,-937.24 1642.91,-862.24
3D body: height 191, standoff 190, extent 2010.41,-1237.24 2092.91,-1162.24
3D body: height 191, standoff 190, extent 2110.41,-1237.24 2192.91,-1162.24
3D body: height 191, standoff 190, extent 2235.41,-1187.24 2317.91,-1112.24
3D body: height 191, standoff 190, extent 2235.41,-1287.24 2317.91,-1212.24
3D body: height 191, standoff 190, extent 2235.41,-1062.24 2317.91,-987.24
3D body: height 191, standoff 190, extent 2235.41,-1412.24 2317.91,-1337.24
3D body: height 191, standoff 190, extent 1955.41,-62.24 2037.91,12.76
3D body: height 191, standoff 190, extent 1955.41,-272.24 2037.91,-197.24
3D body: height 191, standoff 190, extent 1765.42,-437.24 1847.91,-362.24
3D body: height 191, standoff 190, extent 1765.42,-647.24 1847.91,-572.24
3D body: height 200, standoff 190, extent 1716.66,-1064.74 1726.66,-1034.73
3D body: height 200, standoff 190, extent 1736.66,-1064.74 1746.66,-1034.73
3D body: height 200, standoff 190, extent 1756.66,-1064.74 1766.66,-1034.73
3D body: height 200, standoff 190, extent 1776.66,-1064.74 1786.66,-1034.73
3D body: height 200, standoff 190, extent 1796.66,-1064.74 1806.66,-1034.73
3D body: height 200, standoff 190, extent 1816.66,-1064.74 1826.66,-1034.73
3D body: height 200, standoff 190, extent 1836.66,-1064.74 1846.66,-1034.73
3D body: height 200, standoff 190, extent 1856.66,-1064.74 1866.66,-1034.73
3D body: height 200, standoff 190, extent 1876.66,-1064.74 1886.66,-1034.73
3D body: height 200, standoff 190, extent 1896.66,-1064.74 1906.66,-1034.73
3D body: height 200, standoff 190, extent 1896.66,-844.74 1906.66,-814.73
3D body: height 200, standoff 190, extent 1876.66,-844.74 1886.66,-814.73
3D body: height 200, standoff 190, extent 1856.66,-844.74 1866.66,-814.73
3D body: height 200, standoff 190, extent 1836.66,-844.74 1846.66,-814.73
3D body: height 200, standoff 190, extent 1816.66,-844.74 1826.66,-814.73
3D body: height 200, standoff 190, extent 1796.66,-844.74 1806.66,-814.73
3D body: height 200, standoff 190, extent 1776.66,-844.74 1786.66,-814.73
3D body: height 200, standoff 190, extent 1756.66,-844.74 1766.66,-814.73
3D body: height 200, standoff 190, extent 1736.66,-844.74 1746.66,-814.73
3D body: height 200, standoff 190, extent 1716.66,-844.74 1726.66,-814.73
3D body: height 225, standoff 190, extent 1761.66,-769.73 1811.66,-719.74
3D body: height 225, standoff 190, extent 1811.66,-769.73 1821.66,-719.74
3D body: height 225, standoff 190, extent 1751.66,-769.73 1761.66,-719.74
3D body: height 225, standoff 190, extent 1926.65,-804.74 1976.65,-754.73
3D body: height 225, standoff 190, extent 1926.65,-754.73 1976.65,-744.73
3D body: height 225, standoff 190, extent 1926.65,-814.74 1976.65,-804.74
3D body: height 225, standoff 190, extent 1701.65,-1184.74 1751.65,-1134.73
3D body: height 225, standoff 190, extent 1701.65,-1134.73 1751.65,-1124.73
3D body: height 225, standoff 190, extent 1701.65,-1194.74 1751.65,-1184.74
3D body: height 225, standoff 190, extent 1931.65,-1159.74 1981.65,-1109.75
3D body: height 225, standoff 190, extent 1921.65,-1159.74 1931.65,-1109.75
3D body: height 225, standoff 190, extent 1981.65,-1159.74 1991.65,-1109.75
3D body: height 225, standoff 190, extent 1931.65,-1294.74 1981.65,-1244.75
3D body: height 225, standoff 190, extent 1921.65,-1294.74 1931.65,-1244.75
3D body: height 225, standoff 190, extent 1981.65,-1294.74 1991.65,-1244.75
3D body: height 225, standoff 190, extent 1931.65,-1359.74 1981.65,-1309.75
3D body: height 225, standoff 190, extent 1921.65,-1359.74 1931.65,-1309.75
3D body: height 225, standoff 190, extent 1981.65,-1359.74 1991.65,-1309.75
3D body: height 225, standoff 190, extent 1576.65,-1019.74 1626.65,-969.75
3D body: height 225, standoff 190, extent 1566.65,-1019.74 1576.65,-969.75
3D body: height 225, standoff 190, extent 1626.65,-1019.74 1636.65,-969.75
3D body: height 225, standoff 190, extent 1576.65,-1109.74 1626.65,-1059.75
3D body: height 225, standoff 190, extent 1566.65,-1109.74 1576.65,-1059.75
3D body: height 225, standoff 190, extent 1626.65,-1109.74 1636.65,-1059.75
3D body: height 200, standoff 190, extent 2611.65,-539.74 2811.65,-509.74
3D body: height 200, standoff 190, extent 2601.65,-1039.74 2801.65,-1009.74
3D body: height 200, standoff 190, extent 1366.65,-1749.74 1541.66,-1719.74
3D body: height 200, standoff 190, extent 1186.65,-1749.74 1361.66,-1719.74
3D body: height 200, standoff 190, extent 1366.65,-1429.74 1541.66,-1399.74
3D body: height 200, standoff 190, extent 1186.65,-1429.74 1361.66,-1399.74
3D body: height 192, standoff 190, extent 1256.72,-1828.72 1356.66,-1728.75
3D body: height 192, standoff 190, extent 1256.71,-1404.72 1356.66,-1304.75
3D body: height 192, standoff 190, extent 836.77,-524.71 1036.66,-324.76
3D body: height 192, standoff 190, extent 836.77,-649.71 1036.66,-449.76
3D body: height 192, standoff 190, extent 836.77,-774.71 1036.66,-574.77
3D body: height 192, standoff 190, extent 1111.77,-489.71 1311.66,-289.76
3D body: height 192, standoff 190, extent 1111.77,-239.7 1311.66,-39.76
3D body: height 192, standoff 190, extent 836.77,-214.71 1036.66,-14.77
3D body: height 192, standoff 190, extent 836.77,-89.71 1036.66,110.24
3D body: height 192, standoff 190, extent 836.77,35.29 1036.66,235.24
3D body: height 520, standoff 190, extent 561.66,-189.74 686.66,225.26
3D body: height 520, standoff 190, extent 561.66,-759.74 686.66,-344.74
3D body: height 269, standoff 190, extent 1086.66,-219.74 1186.66,-209.74
3D body: height 269, standoff 190, extent 981.66,-219.73 1081.66,-209.73
3D body: height 269, standoff 190, extent 876.66,-219.73 976.66,-209.73
3D body: height 269, standoff 190, extent 771.66,-219.73 871.66,-209.73
3D body: height 269, standoff 190, extent 666.66,-219.73 766.66,-209.73
3D body: height 269, standoff 190, extent 561.66,-219.73 661.66,-209.73
3D body: height 269, standoff 190, extent 456.66,-219.73 556.66,-209.73
3D body: height 269, standoff 190, extent 351.66,-219.73 451.66,-209.73
3D body: height 192, standoff 190, extent 346.66,-214.73 1191.66,-194.74
3D body: height 192, standoff 190, extent 346.66,-344.73 1191.66,-324.74
3D body: height 191, standoff 190, extent -28.34,-1109.74 46.66,-999.74
3D body: height 191, standoff 190, extent 71.66,-1109.74 146.66,-999.74
3D body: height 191, standoff 190, extent -128.34,-1109.74 -53.34,-999.74

## Cap Ceramic 0.1 uF 50V SMT 0603 [mm] "0.1 µF ±5% 50V Ceramic Capacitor X7R 0603 (1608 Metric)"
pads (2):
  rect 1.058x0.912 smd paste+0 mask+0: 1(-0.677,0) 2(0.677,0)
Top Overlay:
  lines w0.2: -1.475,-0.4 -1.475,-0.725 1.475,-0.725 1.475,-0.4 ; -1.475,0.425 -1.475,0.725 1.475,0.725 1.475,0.425
Top Assembly:
  lines w0.2: -1.456,-0.706 -1.456,0.706 1.456,0.706 1.456,-0.706 -1.456,-0.706
Top Courtyard:
  lines w0.2: -1.456,-0.706 -1.456,0.706 1.456,0.706 1.456,-0.706 -1.456,-0.706
Board:
  lines w0.2: -0.8,-0.4 -0.8,0.4 0.8,0.4 0.8,-0.4 -0.8,-0.4
Top Component Center:
  lines w0.1: -0.5,0 0.5,0 ; 0,-0.5 0,0.5
3D body "Cap_YAGEO_CC0603KRX7R9BB271_eec.STEP": height 0.25, standoff 0, extent -1.456,-0.706 1.456,0.706